# Altium footprint library Разъемы.PcbLib: 291 footprints (part 11 of 19)
Each footprint in its own frame and in the unit in brackets; x right, y up, seen from the top. Pads: shape width x height; smd on the part's side, far side on the other; paste and mask are expansions set on the pad; w line width, h text height; cw(c..) or ccw(c..) is an arc to the next point about the centre after c.
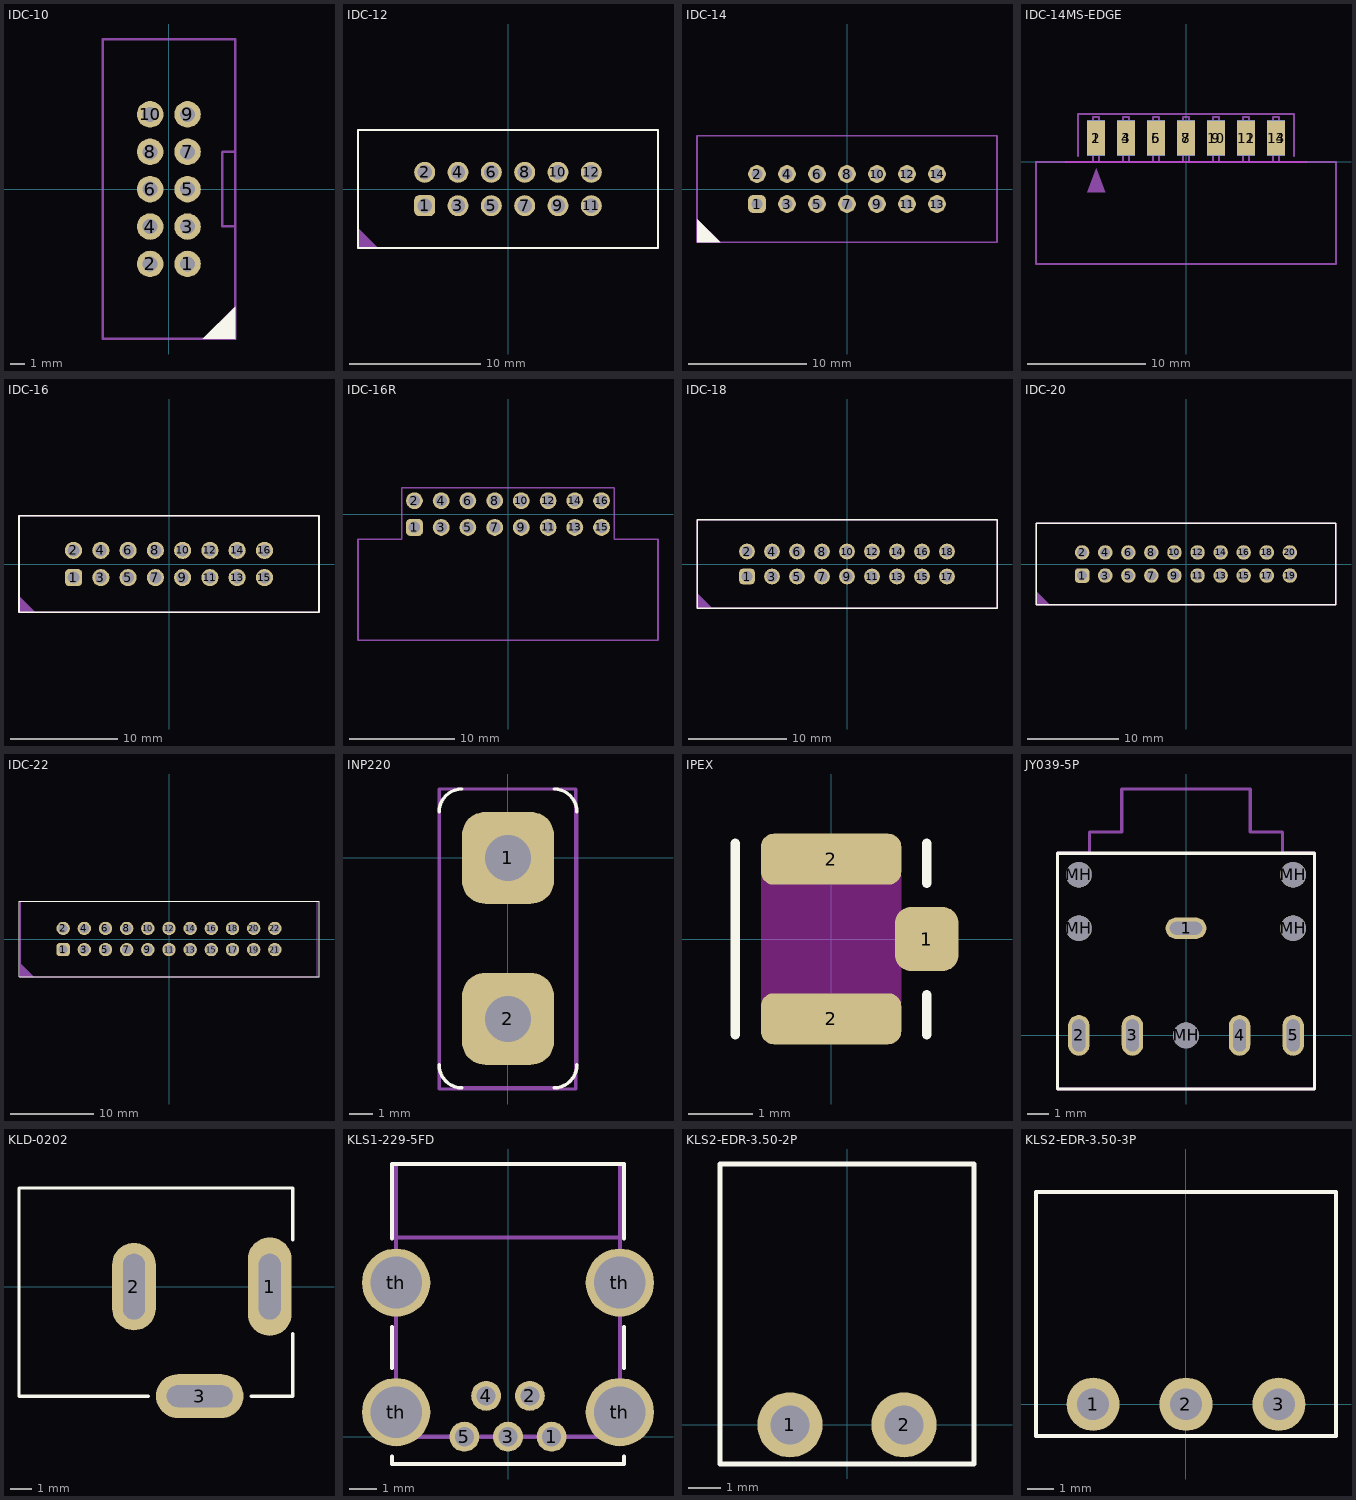
[diagram p10: the footprints below, top view; thin cyan lines are the x and y axes]

## IDC-10 [mm]
pads (10):
  round 1.8 hole 1.02: 1(1.27,-5.08) 2(-1.27,-5.08) 3(1.27,-2.54) 4(-1.27,-2.54) 5(1.27,0) 6(-1.27,0) 7(1.27,2.54) 8(-1.27,2.54) 9(1.27,5.08) 10(-1.27,5.08)
Top Overlay:
  region: 4.5,-10.18 4.495,-10.175 2.3,-10.175 4.5,-7.975
Top Designator:
  text ".Designator" at -3.999,-0.257 h0.8
Mechanical 29:
  region: 4.525,-10.16 4.52,-10.155 2.325,-10.155 4.525,-7.955
  lines w0.15: 3.625,-0.025 3.625,2.525 4.5,2.525 ; 3.625,0.025 3.625,-2.525 4.5,-2.525 ; 3.65,-0.005 3.65,2.545 4.525,2.545 ; 3.65,0.045 3.65,-2.505 4.525,-2.505 ; -4.5,-10.18 4.5,-10.18 4.5,10.18 -4.5,10.18 -4.5,-10.18 ; -4.475,-10.16 4.525,-10.16 4.525,10.2 -4.475,10.2 -4.475,-10.16
  text ".Designator" at -3,-0.3 h1
3D body "IDC-10.STEP": height 9.1, standoff -2.7, extent -4.6,-10.2 4.4,10.15

## IDC-12 [mm]
height 8
pads (12):
  rrect50% 1.6x1.6 hole 1.1: 1(-6.35,-1.27)
  round 1.6 hole 1.1: 2(-6.35,1.27) 3(-3.81,-1.27) 4(-3.81,1.27) 5(-1.27,-1.27) 6(-1.27,1.27) 7(1.27,-1.27) 8(1.27,1.27) 9(3.81,-1.27) 10(3.81,1.27) 11(6.35,-1.27) 12(6.35,1.27)
Top Overlay:
  lines w0.15: -11.43,-4.5 11.43,-4.5 11.43,4.5 -11.43,4.5 -11.43,-4.5
Top Designator:
  text ".Designator" at -3.999,-0.267 h0.8
Mechanical 29:
  region: -11.43,-4.5 -11.43,-2.976 -9.906,-4.5
  lines w0.15: -11.43,-4.5 -11.43,4.5 11.43,4.5 11.43,-4.5 -11.43,-4.5
  text ".Designator" at -3,-0.3 h1
3D body "PLS-1.STEP": height 8.5, standoff -3, extent 5.08,-2.54 7.62,0
3D body "PLS-1.STEP": height 8.5, standoff -3, extent 5.08,0 7.62,2.54
3D body "PLS-1.STEP": height 8.5, standoff -3, extent 2.54,-2.54 5.08,0
3D body "PLS-1.STEP": height 8.5, standoff -3, extent 2.54,0 5.08,2.54
3D body "PLS-1.STEP": height 8.5, standoff -3, extent 0,-2.54 2.54,0
3D body "PLS-1.STEP": height 8.5, standoff -3, extent 0,0 2.54,2.54
3D body "PLS-1.STEP": height 8.5, standoff -3, extent -2.54,-2.54 0,0
3D body "PLS-1.STEP": height 8.5, standoff -3, extent -2.54,0 0,2.54
3D body "PLS-1.STEP": height 8.5, standoff -3, extent -5.08,-2.54 -2.54,0
3D body "PLS-1.STEP": height 8.5, standoff -3, extent -5.08,0 -2.54,2.54
3D body "PLS-1.STEP": height 8.5, standoff -3, extent -7.62,0 -5.08,2.54
3D body "PLS-1.STEP": height 8.5, standoff -3, extent -7.62,-2.54 -5.08,0
3D body: height 9, standoff 0, extent -11.5,-4.5 11.5,4.5
3D body: height 3, standoff 0, extent -11.5,-4.5 11.5,4.5

## IDC-14 [mm]
pads (14):
  rrect50% 1.5x1.5 hole 0.9: 1(-7.62,-1.27)
  round 1.5 hole 0.9: 2(-7.62,1.27) 3(-5.08,-1.27) 4(-5.08,1.27) 5(-2.54,-1.27) 6(-2.54,1.27) 7(0,-1.27) 8(0,1.27) 9(2.54,-1.27) 10(2.54,1.27) 11(5.08,-1.27) 12(5.08,1.27) 13(7.62,-1.27) 14(7.62,1.27)
Top Overlay:
  region: -12.7,-4.5 -12.7,-2.54 -10.74,-4.5
Top Designator:
  text ".Designator" at -3.999,-0.089 h0.8
Mechanical 29:
  region: -12.664,-4.5 -12.664,-2.54 -10.704,-4.5
  lines w0.15: -12.7,-4.5 12.7,-4.5 ; -12.7,-4.5 -12.7,4.5 ; -12.7,-4.5 -12.7,4.5 ; -12.7,-4.5 12.7,-4.5 ; -12.7,4.5 12.7,4.5 ; -12.7,4.5 12.7,4.5 ; 12.7,-4.5 12.7,4.5 ; 12.7,-4.5 12.7,4.5
  text ".Designator" at -3,-0.3 h1
3D body "IDC-14MS.STEP": height 10.25, standoff -2.45, extent -12.725,-4.42 12.675,4.93

## IDC-14MS-EDGE [mm]
pads (14):
  rect 1.5x3 smd far side: 1(-7.62,2) 3(-5.08,2) 5(-2.54,2) 7(0,2) 9(2.54,2) 11(5.08,2) 13(7.62,2)
  rect 1.5x3 smd: 2(-7.62,2) 4(-5.08,2) 6(-2.54,2) 8(0,2) 10(2.54,2) 12(5.08,2) 14(7.62,2)
Bottom Overlay:
  region: -9.144,4.032 -9.144,0.476 -8.636,0.476 -8.636,4.032
  lines w0.15: -9.144,0.476 -9.144,4.032 0,4.032 9.144,4.032 9.144,0.476
Keep-Out Layer:
  lines w0.15: -10.16,-0.032 10.16,-0.032
Top Designator:
  text ".Designator" at -3.999,-2.585 h0.8
Mechanical 29:
  lines w0.15: -9.144,0.476 -9.144,4.032 0,4.032 9.144,4.032 9.144,0.476 ; -12.7,-8.668 -12.7,-0.032 12.7,-0.032 12.7,-8.668 -12.7,-8.668 ; -7.874,-0.032 -7.366,-0.032 -7.366,3.778 -7.874,3.778 -7.874,-0.032 ; -5.334,-0.032 -5.334,3.778 -4.826,3.778 -4.826,-0.032 -5.334,-0.032 ; -2.794,-0.032 -2.794,3.778 -2.286,3.778 -2.286,-0.032 -2.794,-0.032 ; -0.254,-0.032 -0.254,3.778 0.254,3.778 0.254,-0.032 -0.254,-0.032 ; 2.286,-0.032 2.286,3.778 2.794,3.778 2.794,-0.032 2.286,-0.032 ; 4.826,-0.032 4.826,3.778 5.334,3.778 5.334,-0.032 4.826,-0.032 ; 7.366,-0.032 7.366,3.778 7.874,3.778 7.874,-0.032 7.366,-0.032
Mechanical 30:
  region: -7.62,-0.54 -8.382,-2.572 -6.858,-2.572
  lines w0.15: -12.7,-8.668 12.7,-8.668 12.7,-0.032 -12.7,-0.032 -12.7,-8.668 ; -7.874,-0.032 -7.874,3.778 -7.366,3.778 -7.366,-0.032 -7.874,-0.032 ; -5.334,-0.032 -4.826,-0.032 -4.826,3.778 -5.334,3.778 -5.334,-0.032 ; -2.794,-0.032 -2.286,-0.032 -2.286,3.778 -2.794,3.778 -2.794,-0.032 ; -0.254,-0.032 0.254,-0.032 0.254,3.778 -0.254,3.778 -0.254,-0.032 ; 2.286,-0.032 2.794,-0.032 2.794,3.778 2.286,3.778 2.286,-0.032 ; 4.826,-0.032 5.334,-0.032 5.334,3.778 4.826,3.778 4.826,-0.032 ; 7.366,-0.032 7.874,-0.032 7.874,3.778 7.366,3.778 7.366,-0.032
  text ".Designator" at 4.318,-5.112 h2
3D body "IDC-14MS.STEP": height 3.57, standoff -5.77, extent -12.7,-8.719 12.7,3.981

## IDC-16 [mm]
height 8
pads (16):
  rrect50% 1.6x1.6 hole 1.1: 1(-8.89,-1.27)
  round 1.6 hole 1.1: 2(-8.89,1.27) 3(-6.35,-1.27) 4(-6.35,1.27) 5(-3.81,-1.27) 6(-3.81,1.27) 7(-1.27,-1.27) 8(-1.27,1.27) 9(1.27,-1.27) 10(1.27,1.27) 11(3.81,-1.27) 12(3.81,1.27) 13(6.35,-1.27) 14(6.35,1.27) 15(8.89,-1.27) 16(8.89,1.27)
Top Overlay:
  lines w0.15: -13.97,-4.5 -13.97,4.5 13.97,4.5 13.97,-4.5 -13.97,-4.5
Top Designator:
  text ".Designator" at -3.999,-0.267 h0.8
Mechanical 29:
  region: -13.97,-4.5 -13.97,-2.976 -12.446,-4.5
  lines w0.15: -13.97,-4.5 13.97,-4.5 13.97,4.5 -13.97,4.5 -13.97,-4.5
  text ".Designator" at -3.5,-0.3 h1
3D body: height 3, standoff 0, extent -14,-4.5 14,4.5
3D body: height 9, standoff 0, extent -14,-4.5 14,4.5
3D body "PLS-1.STEP": height 8.5, standoff -3, extent -10.16,-2.54 -7.62,0
3D body "PLS-1.STEP": height 8.5, standoff -3, extent -10.16,0 -7.62,2.54
3D body "PLS-1.STEP": height 8.5, standoff -3, extent -7.62,0 -5.08,2.54
3D body "PLS-1.STEP": height 8.5, standoff -3, extent -7.62,-2.54 -5.08,0
3D body "PLS-1.STEP": height 8.5, standoff -3, extent -5.08,0 -2.54,2.54
3D body "PLS-1.STEP": height 8.5, standoff -3, extent -5.08,-2.54 -2.54,0
3D body "PLS-1.STEP": height 8.5, standoff -3, extent -2.54,0 0,2.54
3D body "PLS-1.STEP": height 8.5, standoff -3, extent -2.54,-2.54 0,0
3D body "PLS-1.STEP": height 8.5, standoff -3, extent 0,0 2.54,2.54
3D body "PLS-1.STEP": height 8.5, standoff -3, extent 0,-2.54 2.54,0
3D body "PLS-1.STEP": height 8.5, standoff -3, extent 2.54,0 5.08,2.54
3D body "PLS-1.STEP": height 8.5, standoff -3, extent 2.54,-2.54 5.08,0
3D body "PLS-1.STEP": height 8.5, standoff -3, extent 5.08,0 7.62,2.54
3D body "PLS-1.STEP": height 8.5, standoff -3, extent 7.62,0 10.16,2.54
3D body "PLS-1.STEP": height 8.5, standoff -3, extent 7.62,-2.54 10.16,0
3D body "PLS-1.STEP": height 8.5, standoff -3, extent 5.08,-2.54 7.62,0

## IDC-16R [mm]
height 8
pads (16):
  rrect50% 1.6x1.6 hole 1.1: 1(-8.89,-1.27)
  round 1.6 hole 1.1: 2(-8.89,1.27) 3(-6.35,-1.27) 4(-6.35,1.27) 5(-3.81,-1.27) 6(-3.81,1.27) 7(-1.27,-1.27) 8(-1.27,1.27) 9(1.27,-1.27) 10(1.27,1.27) 11(3.81,-1.27) 12(3.81,1.27) 13(6.35,-1.27) 14(6.35,1.27) 15(8.89,-1.27) 16(8.89,1.27)
Top Courtyard:
  lines w0.15: -14.249,-11.97 14.25,-11.97 14.25,-2.395 10.1,-2.395 10.1,2.48 -10.1,2.48 -10.1,-2.395 -14.25,-2.395 -14.25,-11.97
Top Designator:
  text ".Designator" at -3.999,-5.012 h0.8
3D body "User Library-IDC Socket Male 6pin Angled THT Goldplated 2_54mm.step": height 8.85, standoff -2.5, extent -1.58,-11.97 14.28,1.59
3D body "User Library-IDC Socket Male 6pin Angled THT Goldplated 2_54mm.step": height 8.85, standoff -2.5, extent -14.28,-11.97 1.58,1.59
3D body "User Library-IDC Socket Male 6pin Angled THT Goldplated 2_54mm.step": height 8.85, standoff -2.5, extent -9.2,-11.97 6.66,1.59

## IDC-18 [mm]
height 8
pads (18):
  rrect50% 1.6x1.6 hole 1.1: 1(-10.16,-1.27)
  round 1.6 hole 1.1: 2(-10.16,1.27) 3(-7.62,-1.27) 4(-7.62,1.27) 5(-5.08,-1.27) 6(-5.08,1.27) 7(-2.54,-1.27) 8(-2.54,1.27) 9(0,-1.27) 10(0,1.27) 11(2.54,-1.27) 12(2.54,1.27) 13(5.08,-1.27) 14(5.08,1.27) 15(7.62,-1.27) 16(7.62,1.27) 17(10.16,-1.27) 18(10.16,1.27)
Top Overlay:
  lines w0.15: -15.24,-4.5 -15.24,4.5 15.24,4.5 15.24,-4.5 -15.24,-4.5
Mechanical 29:
  region: -15.24,-4.5 -15.24,-2.976 -13.716,-4.5
  lines w0.15: -15.24,-4.5 15.24,-4.5 15.24,4.5 -15.24,4.5 -15.24,-4.5
3D body "PLS-1.STEP": height 8.5, standoff -3, extent -11.43,-2.54 -8.89,0
3D body "PLS-1.STEP": height 8.5, standoff -3, extent -11.43,0 -8.89,2.54
3D body "PLS-1.STEP": height 8.5, standoff -3, extent -8.89,0 -6.35,2.54
3D body "PLS-1.STEP": height 8.5, standoff -3, extent -8.89,-2.54 -6.35,0
3D body "PLS-1.STEP": height 8.5, standoff -3, extent -6.35,0 -3.81,2.54
3D body "PLS-1.STEP": height 8.5, standoff -3, extent -6.35,-2.54 -3.81,0
3D body "PLS-1.STEP": height 8.5, standoff -3, extent -3.81,0 -1.27,2.54
3D body "PLS-1.STEP": height 8.5, standoff -3, extent -3.81,-2.54 -1.27,0
3D body "PLS-1.STEP": height 8.5, standoff -3, extent -1.27,0 1.27,2.54
3D body "PLS-1.STEP": height 8.5, standoff -3, extent -1.27,-2.54 1.27,0
3D body "PLS-1.STEP": height 8.5, standoff -3, extent 1.27,0 3.81,2.54
3D body "PLS-1.STEP": height 8.5, standoff -3, extent 1.27,-2.54 3.81,0
3D body "PLS-1.STEP": height 8.5, standoff -3, extent 3.81,0 6.35,2.54
3D body "PLS-1.STEP": height 8.5, standoff -3, extent 6.35,0 8.89,2.54
3D body "PLS-1.STEP": height 8.5, standoff -3, extent 8.89,0 11.43,2.54
3D body "PLS-1.STEP": height 8.5, standoff -3, extent 8.89,-2.54 11.43,0
3D body "PLS-1.STEP": height 8.5, standoff -3, extent 6.35,-2.54 8.89,0
3D body "PLS-1.STEP": height 8.5, standoff -3, extent 3.81,-2.54 6.35,0
3D body: height 3, standoff 0, extent -15.5,-4.5 15.5,4.5
3D body: height 9, standoff 0, extent -15.5,-4.5 15.5,4.5

## IDC-20 [mm]
height 8
pads (20):
  rrect50% 1.6x1.6 hole 1.1: 1(-11.43,-1.27)
  round 1.6 hole 1.1: 2(-11.43,1.27) 3(-8.89,-1.27) 4(-8.89,1.27) 5(-6.35,-1.27) 6(-6.35,1.27) 7(-3.81,-1.27) 8(-3.81,1.27) 9(-1.27,-1.27) 10(-1.27,1.27) 11(1.27,-1.27) 12(1.27,1.27) 13(3.81,-1.27) 14(3.81,1.27) 15(6.35,-1.27) 16(6.35,1.27) 17(8.89,-1.27) 18(8.89,1.27) 19(11.43,-1.27) 20(11.43,1.27)
Top Overlay:
  lines w0.15: -16.51,-4.5 -16.51,4.5 16.51,4.5 16.51,-4.5 -16.51,-4.5
Mechanical 29:
  region: -16.51,-4.5 -16.51,-2.976 -14.986,-4.5
  lines w0.15: -16.51,-4.5 16.51,-4.5 16.51,4.5 -16.51,4.5 -16.51,-4.5
3D body "PLS-1.STEP": height 8.5, standoff -3, extent -12.7,-2.54 -10.16,0
3D body "PLS-1.STEP": height 8.5, standoff -3, extent -12.7,0 -10.16,2.54
3D body "PLS-1.STEP": height 8.5, standoff -3, extent -10.16,0 -7.62,2.54
3D body "PLS-1.STEP": height 8.5, standoff -3, extent -10.16,-2.54 -7.62,0
3D body "PLS-1.STEP": height 8.5, standoff -3, extent -7.62,0 -5.08,2.54
3D body "PLS-1.STEP": height 8.5, standoff -3, extent -7.62,-2.54 -5.08,0
3D body "PLS-1.STEP": height 8.5, standoff -3, extent -5.08,0 -2.54,2.54
3D body "PLS-1.STEP": height 8.5, standoff -3, extent -5.08,-2.54 -2.54,0
3D body "PLS-1.STEP": height 8.5, standoff -3, extent -2.54,0 0,2.54
3D body "PLS-1.STEP": height 8.5, standoff -3, extent -2.54,-2.54 0,0
3D body "PLS-1.STEP": height 8.5, standoff -3, extent 0,0 2.54,2.54
3D body "PLS-1.STEP": height 8.5, standoff -3, extent 0,-2.54 2.54,0
3D body "PLS-1.STEP": height 8.5, standoff -3, extent 2.54,0 5.08,2.54
3D body "PLS-1.STEP": height 8.5, standoff -3, extent 5.08,0 7.62,2.54
3D body "PLS-1.STEP": height 8.5, standoff -3, extent 7.62,0 10.16,2.54
3D body "PLS-1.STEP": height 8.5, standoff -3, extent 10.16,0 12.7,2.54
3D body "PLS-1.STEP": height 8.5, standoff -3, extent 10.16,-2.54 12.7,0
3D body "PLS-1.STEP": height 8.5, standoff -3, extent 7.62,-2.54 10.16,0
3D body "PLS-1.STEP": height 8.5, standoff -3, extent 5.08,-2.54 7.62,0
3D body "PLS-1.STEP": height 8.5, standoff -3, extent 2.54,-2.54 5.08,0
3D body: height 3, standoff 0, extent -16.5,-4.5 16.5,4.5
3D body: height 9, standoff 0, extent -16.5,-4.5 16.5,4.5

## IDC-22 [mm]
height 8
pads (22):
  rrect50% 1.6x1.6 hole 1.1: 1(-12.7,-1.27)
  round 1.6 hole 1.1: 2(-12.7,1.27) 3(-10.16,-1.27) 4(-10.16,1.27) 5(-7.62,-1.27) 6(-7.62,1.27) 7(-5.08,-1.27) 8(-5.08,1.27) 9(-2.54,-1.27) 10(-2.54,1.27) 11(0,-1.27) 12(0,1.27) 13(2.54,-1.27) 14(2.54,1.27) 15(5.08,-1.27) 16(5.08,1.27) 17(7.62,-1.27) 18(7.62,1.27) 19(10.16,-1.27) 20(10.16,1.27) 21(12.7,-1.27) 22(12.7,1.27)
Top Overlay:
  lines w0.15: -18,-4.5 -18,4.5 18,4.5 18,-4.5 -18,-4.5
Mechanical 29:
  region: -17.78,-4.5 -17.78,-2.976 -16.256,-4.5
  lines w0.15: -17.78,-4.5 17.78,-4.5 17.78,4.5 -17.78,4.5 -17.78,-4.5
3D body "PLS-1.STEP": height 8.5, standoff -3, extent -13.97,-2.54 -11.43,0
3D body "PLS-1.STEP": height 8.5, standoff -3, extent -13.97,0 -11.43,2.54
3D body "PLS-1.STEP": height 8.5, standoff -3, extent -11.43,0 -8.89,2.54
3D body "PLS-1.STEP": height 8.5, standoff -3, extent -11.43,-2.54 -8.89,0
3D body "PLS-1.STEP": height 8.5, standoff -3, extent -8.89,0 -6.35,2.54
3D body "PLS-1.STEP": height 8.5, standoff -3, extent -8.89,-2.54 -6.35,0
3D body "PLS-1.STEP": height 8.5, standoff -3, extent -6.35,0 -3.81,2.54
3D body "PLS-1.STEP": height 8.5, standoff -3, extent -6.35,-2.54 -3.81,0
3D body "PLS-1.STEP": height 8.5, standoff -3, extent -3.81,0 -1.27,2.54
3D body "PLS-1.STEP": height 8.5, standoff -3, extent -3.81,-2.54 -1.27,0
3D body "PLS-1.STEP": height 8.5, standoff -3, extent -1.27,0 1.27,2.54
3D body "PLS-1.STEP": height 8.5, standoff -3, extent -1.27,-2.54 1.27,0
3D body "PLS-1.STEP": height 8.5, standoff -3, extent 1.27,0 3.81,2.54
3D body "PLS-1.STEP": height 8.5, standoff -3, extent 3.81,0 6.35,2.54
3D body "PLS-1.STEP": height 8.5, standoff -3, extent 6.35,0 8.89,2.54
3D body "PLS-1.STEP": height 8.5, standoff -3, extent 8.89,0 11.43,2.54
3D body "PLS-1.STEP": height 8.5, standoff -3, extent 11.43,0 13.97,2.54
3D body "PLS-1.STEP": height 8.5, standoff -3, extent 11.43,-2.54 13.97,0
3D body "PLS-1.STEP": height 8.5, standoff -3, extent 8.89,-2.54 11.43,0
3D body "PLS-1.STEP": height 8.5, standoff -3, extent 6.35,-2.54 8.89,0
3D body "PLS-1.STEP": height 8.5, standoff -3, extent 3.81,-2.54 6.35,0
3D body "PLS-1.STEP": height 8.5, standoff -3, extent 1.27,-2.54 3.81,0
3D body: height 9, standoff 0, extent -18,-4.5 18,4.5
3D body: height 3, standoff 0, extent -18,-4.5 18,4.5

## INP220 [mm]
pads (2):
  rrect50% 4x4 hole 2: 1(0,0) 2(0,-7)
Top Overlay:
  lines w0.15: -3,-9 ccw(c-2,-9) -2,-10 ; -3,2 cw(c-2,2) -2,3 ; 2,-10 ccw(c2,-9) 3,-9 ; 2,3 cw(c2,2) 3,2
Top Designator:
  text ".Designator" at -3.064,-3.792 h0.8
Mechanical 29:
  lines w0.15: -3,-9 -3,2 ; -2,-10 2,-10 ; -2,3 2,3 ; 3,-9 3,2 ; -3,-10.05 -3,3 2.95,3 2.95,-10.05 -3,-10.05
  text ".Designator" at -2.5,-3.8 h1

## IPEX [mm]
height 7.05
pads (3):
  rrect50% 1x1 smd: 1(1.5,0)
  rrect50% 2.2x0.8 smd: 2(0,-1.25) 2(0,1.25)
Top Layer keep-out:
  rectangle: -1.1,-1 1.1,1
Top Overlay:
  lines w0.15: -1.5,-1.5 -1.5,1.5 ; 1.5,-1.5 1.5,-0.877 ; 1.5,0.877 1.5,1.5
3D body "IPEX U.FL-R-SMT-IPEX U.step": height 1.29, standoff -0.01, extent -1.55,-1.5 1.55,1.5

## JY039-5P [mm]
pads (10):
  oval 1.9x1 hole 0.6 slot 1.5 at 0 deg: 1(0,5)
  oval 1x1.9 hole 0.6 slot 1.5 at 90 deg: 2(-5,0) 3(-2.5,0) 4(2.5,0) 5(5,0)
  round 1.2 hole 1.2 unplated: MH(-5,5) MH(-5,7.5) MH(0,0) MH(5,5) MH(5,7.5)
Top Overlay:
  lines w0.15: -6,-2.5 -6,8.5 -4.5,8.5 4.5,8.5 6,8.5 6,-2.5 0.5,-2.5 -6,-2.5
Top Courtyard:
  lines w0.15: -6,-2.5 -6,8.5 -4.5,8.5 -4.5,9.5 -3,9.5 -3,11.5 -1,11.5 3,11.5 3,9.5 4.5,9.5 4.5,8.5 6,8.5 6,-2.5 0,-2.5 -6,-2.5
Top Designator:
  text ".Designator" at -3.999,4.233 h0.8
3D body: height 5.5, standoff -0.5, extent -3,8.5 3,11.5
3D body: height 5, standoff 0.1, extent -6,-2.5 6,9.5

## KLD-0202 [mm] "DC Power Jack, 2.5mm, KLD Series, PCB Mount"
height 1.99
pads (3):
  oval 2x4.5 hole 1 slot 3 at 90 deg: 1(13.7,0)
  oval 2x4 hole 1 slot 3 at 90 deg: 2(7.5,0)
  oval 4x2 hole 1 slot 3 at 0 deg: 3(10.5,-5)
Top Overlay:
  lines w0.15: 8.146,-5 2.25,-5 2.25,4.5 14.75,4.5 14.75,2.14 ; 12.854,-5 14.75,-5 14.75,-2.14
3D body "User Library-KLD-0202-AC.step": height 11, standoff -3.7, extent 0.194,-4.925 14.825,4.475

## KLS1-229-5FD [mm]
pads (9):
  round 1.1 hole 0.7: 1(1.6,0) 2(0.8,1.5) 3(0,0) 4(-0.8,1.5) 5(-1.6,0)
  round 2.5 hole 1.9: th(-4.1,0.9) th(-4.1,5.65) th(4.1,0.9) th(4.1,5.65)
Top Overlay:
  lines w0.15: -4.25,-0.72 -4.25,-1 4.25,-1 4.25,-0.72 ; -4.25,2.52 -4.25,4.03 ; -4.25,7.27 -4.25,10 4.25,10 4.25,7.27 ; 4.25,2.52 4.25,4.03
Mechanical 29:
  lines w0.15: -4.1,2.5 -4.1,4 ; -4.1,7.3 0,7.3 4.1,7.3 ; 4.1,2.5 4.1,4 ; -4.1,0 -4.1,10 0,10 4.1,10 4.1,0 0,0 -4.1,0

## KLS2-EDR-3.50-2P [mm]
pads (2):
  round 2 hole 1.2: 1(-1.75,0) 2(1.75,0)
Top Overlay:
  lines w0.15: -3.9,-1.2 0,-1.2 3.9,-1.2 3.9,8 0,8 -3.9,8 -3.9,-1.2
3D body: height 7, standoff 0, extent -3.9,-1.2 3.9,8

## KLS2-EDR-3.50-3P [mm]
pads (3):
  round 2 hole 1.2: 1(-3.5,0) 2(0,0) 3(3.5,0)
Top Overlay:
  lines w0.15: -5.65,-1.2 -1.75,-1.2 5.65,-1.2 5.65,8 -1.75,8 -5.65,8 -5.65,-1.2
3D body: height 7, standoff 0, extent -5.65,-1.2 5.65,8